# Altium footprint library PartsDatabaseV16.1.PcbLib: 145 footprints (part 7 of 10)
Each footprint in its own frame and in the unit in brackets; x right, y up, seen from the top. Pads: shape width x height; smd on the part's side, far side on the other; paste and mask are expansions set on the pad; w line width, h text height; cw(c..) or ccw(c..) is an arc to the next point about the centre after c.
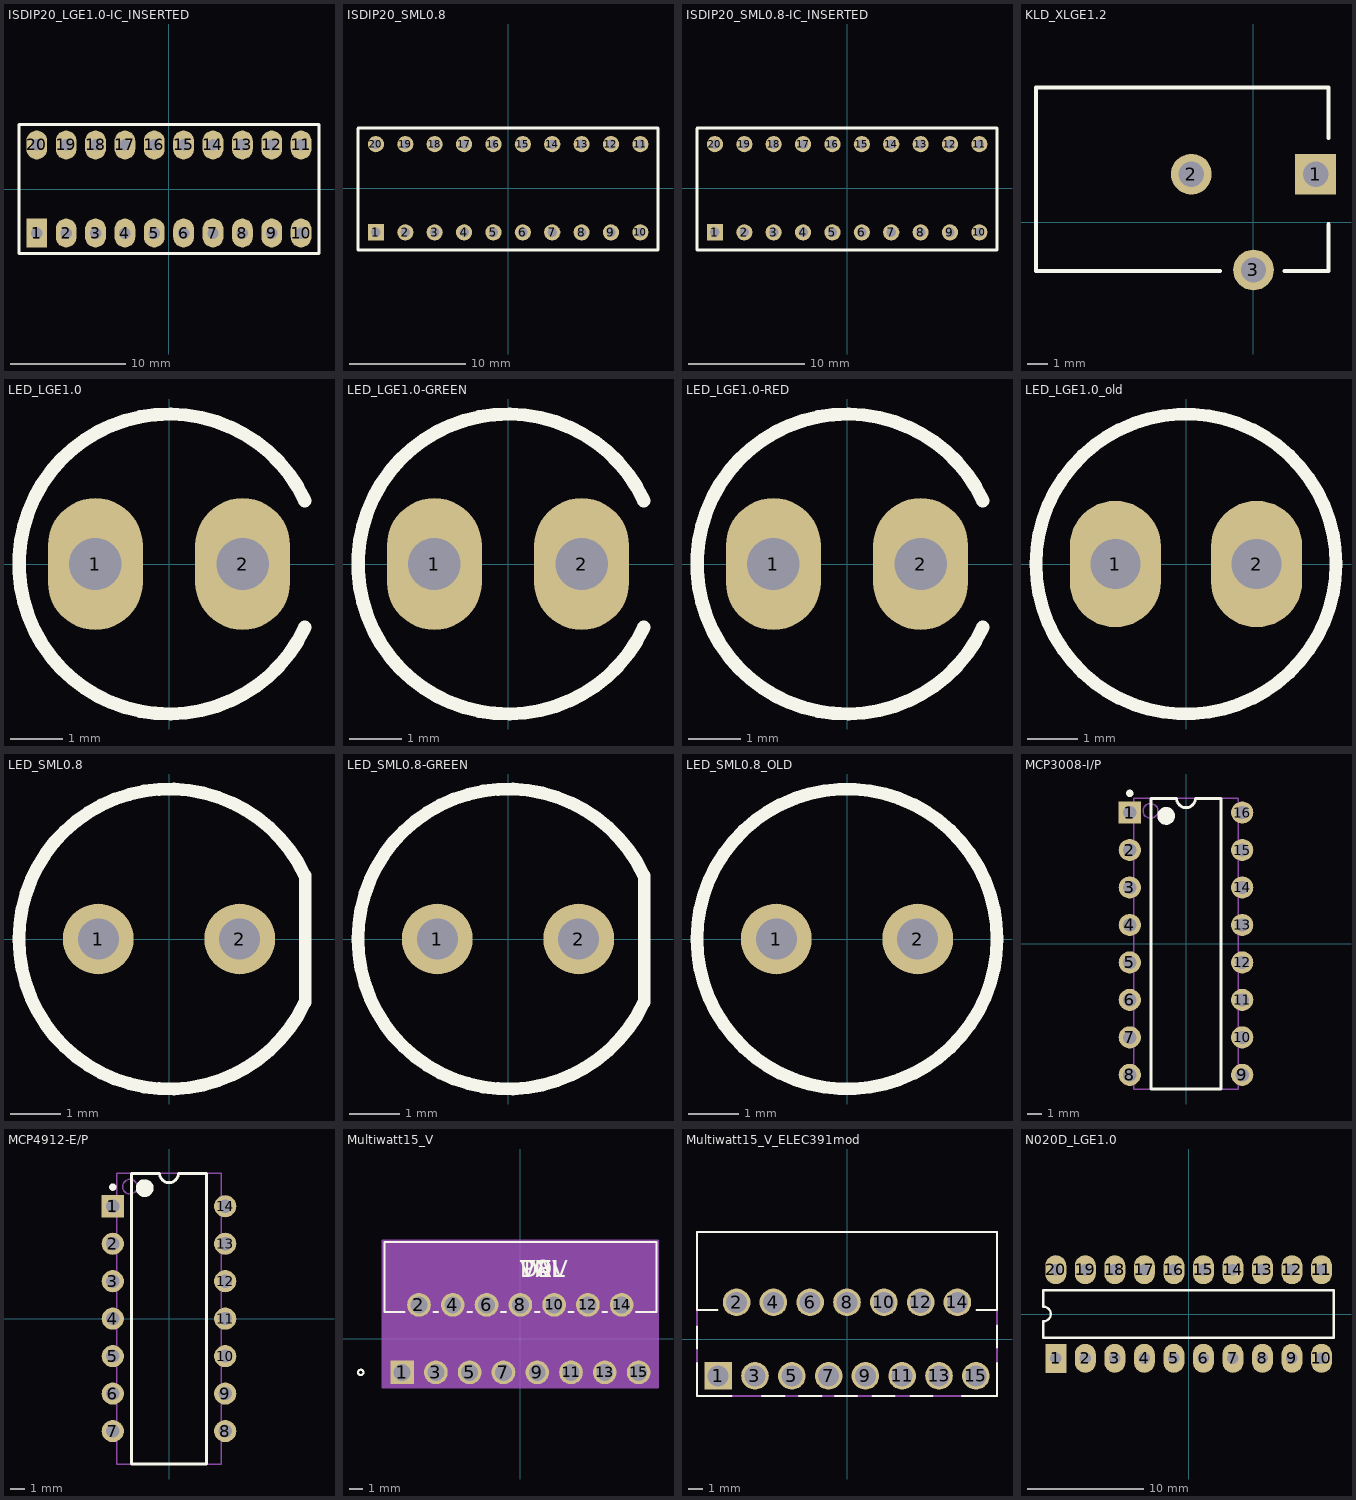
[diagram p6: the footprints below, top view; thin cyan lines are the x and y axes]

## ISDIP20_LGE1.0-IC_INSERTED [mm] "DIP; 16 Rectangular Pins; Row Space 7.62 mm; Pitch 2.54 mm"
height 11.94
pads (20):
  rect 1.8x2.5 hole 0.991: 1(-11.43,-3.81)
  oval 1.8x2.5 hole 0.991: 2(-8.89,-3.81) 3(-6.35,-3.81) 4(-3.81,-3.81) 5(-1.27,-3.81) 6(1.27,-3.81) 7(3.81,-3.81) 8(6.35,-3.81) 9(8.89,-3.81) 10(11.43,-3.81) 11(11.43,3.81) 12(8.89,3.81) 13(6.35,3.81) 14(3.81,3.81) 15(1.27,3.81) 16(-1.27,3.81) 17(-3.81,3.81) 18(-6.35,3.81) 19(-8.89,3.81) 20(-11.43,3.81)
Top Overlay:
  lines w0.25: 12.97,-5.588 -12.97,-5.588 -12.97,3.175 -12.97,5.588 12.97,5.588 ; 12.979,-5.588 12.979,5.588
3D body "DIP20.STEP": height 8.34, standoff -0.04, extent -13.245,-3.834 13.295,3.986
3D body "DIP20_socket.step": height 5, standoff -3, extent -12.763,-5.093 12.637,5.067

## ISDIP20_SML0.8 [mm] "DIP; 16 Rectangular Pins; Row Space 7.62 mm; Pitch 2.54 mm"
height 11.94
pads (20):
  rect 1.4x1.4 hole 0.813: 1(-11.43,-3.81)
  round 1.4 hole 0.813: 2(-8.89,-3.81) 3(-6.35,-3.81) 4(-3.81,-3.81) 5(-1.27,-3.81) 6(1.27,-3.81) 7(3.81,-3.81) 8(6.35,-3.81) 9(8.89,-3.81) 10(11.43,-3.81) 11(11.43,3.81) 12(8.89,3.81) 13(6.35,3.81) 14(3.81,3.81) 15(1.27,3.81) 16(-1.27,3.81) 17(-3.81,3.81) 18(-6.35,3.81) 19(-8.89,3.81) 20(-11.43,3.81)
Top Overlay:
  lines w0.25: -12.97,-5.34 12.954,-5.34 12.954,5.169 ; -12.954,5.207 12.954,5.207
  lines w0.254: -12.979,-5.309 -12.979,5.182
3D body "DIP20_socket.step": height 5, standoff -3, extent -12.725,-5.029 12.675,5.131

## ISDIP20_SML0.8-IC_INSERTED [mm] "DIP; 16 Rectangular Pins; Row Space 7.62 mm; Pitch 2.54 mm"
height 11.94
pads (20):
  rect 1.4x1.4 hole 0.813: 1(-11.43,-3.81)
  round 1.4 hole 0.813: 2(-8.89,-3.81) 3(-6.35,-3.81) 4(-3.81,-3.81) 5(-1.27,-3.81) 6(1.27,-3.81) 7(3.81,-3.81) 8(6.35,-3.81) 9(8.89,-3.81) 10(11.43,-3.81) 11(11.43,3.81) 12(8.89,3.81) 13(6.35,3.81) 14(3.81,3.81) 15(1.27,3.81) 16(-1.27,3.81) 17(-3.81,3.81) 18(-6.35,3.81) 19(-8.89,3.81) 20(-11.43,3.81)
Top Overlay:
  lines w0.25: -12.97,-5.34 12.954,-5.34 12.954,5.169 ; -12.954,5.207 12.954,5.207
  lines w0.254: -12.979,-5.309 -12.979,5.182
3D body "DIP20_socket.step": height 5, standoff -3, extent -12.738,-5.169 12.662,4.991
3D body "DIP20.STEP": height 8.56, standoff 0.18, extent -13.283,-3.885 13.257,3.935

## KLD_XLGE1.2 [mil] "DC Power Jack, PCB Mount"
pads (3):
  rect 78.74x78.74 hole 49: 1(120,92.5)
  round 78.74 hole 49: 2(-120,92.5) 3(0,-92.5)
Top Overlay:
  lines w7.87: -65,-94.67 -420,-94.67 -420,259.67 145,259.67 145,162.5 ; 60,-94.67 145,-94.67 145,-4.11
3D body "PwrJack2.1mm.step": height 433.55, standoff -137.32, extent -453.22,-103.08 145.21,267

## LED_LGE1.0 [mm] "2.8 mm (typ)"
pads (2):
  oval 1.8x2.5 hole 0.991: 1(-1.397,0) 2(1.397,0)
Top Overlay:
  lines w0.254: 2.578,-1.202 cw(c0,0) 2.578,1.202
3D body "redLED.STEP": height 12.3, standoff -2.5, extent -2.984,-3.048 2.436,2.972

## LED_LGE1.0-GREEN [mm] "2.8 mm (typ)"
pads (2):
  oval 1.8x2.5 hole 0.991: 1(-1.397,0) 2(1.397,0)
Top Overlay:
  lines w0.254: 2.578,-1.202 cw(c0,0) 2.578,1.202

## LED_LGE1.0-RED [mm] "2.8 mm (typ)"
pads (2):
  oval 1.8x2.5 hole 0.991: 1(-1.397,0) 2(1.397,0)
Top Overlay:
  lines w0.254: 2.578,-1.202 cw(c0,0) 2.578,1.202
3D body "redLED.STEP": height 12.3, standoff -2.5, extent -3.058,-2.883 2.362,3.137

## LED_LGE1.0_old [mm] "2.8 mm (typ)"
pads (2):
  oval 1.8x2.5 hole 0.991: 1(-1.397,0) 2(1.397,0)
Top Overlay:
  circle w0.254: c0,0 r2.965
3D body "redLED.STEP": height 12.3, standoff -2.5, extent -2.415,-3.022 3.005,2.997

## LED_SML0.8 [mm] "2.8 mm (typ)"
pads (2):
  round 1.4 hole 0.813: 1(-1.397,0) 2(1.397,0)
Top Overlay:
  lines w0.254: 2.687,-1.253 cw(c0,0) 2.687,1.253 ; 2.692,-1.232 2.692,1.257

## LED_SML0.8-GREEN [mm] "2.8 mm (typ)"
pads (2):
  round 1.4 hole 0.813: 1(-1.397,0) 2(1.397,0)
Top Overlay:
  lines w0.254: 2.687,-1.253 cw(c0,0) 2.687,1.253 ; 2.692,-1.194 2.692,1.245

## LED_SML0.8_OLD [mm] "2.8 mm (typ)"
pads (2):
  round 1.4 hole 0.813: 1(-1.397,0) 2(1.397,0)
Top Overlay:
  circle w0.254: c0,0 r2.965

## MCP3008-I/P [mm] "ADC (16-DIP)"
pads (16):
  rect 1.5x1.5 hole 0.889: 1(-3.81,8.89)
  round 1.5 hole 0.889: 2(-3.81,6.35) 3(-3.81,3.81) 4(-3.81,1.27) 5(-3.81,-1.27) 6(-3.81,-3.81) 7(-3.81,-6.35) 8(-3.81,-8.89) 9(3.81,-8.89) 10(3.81,-6.35) 11(3.81,-3.81) 12(3.81,-1.27) 13(3.81,1.27) 14(3.81,3.81) 15(3.81,6.35) 16(3.81,8.89)
Top Overlay:
  circle w0.25: c-3.81,10.19 r0.125
  circle w0.6: c-1.346,8.661 r0.3
  lines w0.2: -2.362,-9.85 -2.362,9.85 -0.635,9.85 ccw(c0,9.85) 0.635,9.85 2.362,9.85 2.362,-9.85 -2.362,-9.85
Mechanical 13:
  circle w0.1: c-2.4,9 r0.5
  lines w0.1: -3.55,-9.85 -3.55,9.85 3.55,9.85 3.55,-9.85 -3.55,-9.85
3D body: height 5.34, standoff 0.38, extent -3.549,-9.849 3.549,9.849

## MCP4912-E/P [mm] "DAC (14-DIP)"
height 5.34
pads (14):
  rect 1.5x1.5 hole 0.889: 1(-3.81,7.62)
  round 1.5 hole 0.889: 2(-3.81,5.08) 3(-3.81,2.54) 4(-3.81,0) 5(-3.81,-2.54) 6(-3.81,-5.08) 7(-3.81,-7.62) 8(3.81,-7.62) 9(3.81,-5.08) 10(3.81,-2.54) 11(3.81,0) 12(3.81,2.54) 13(3.81,5.08) 14(3.81,7.62)
Top Overlay:
  circle w0.6: c-1.65,8.85 r0.3
  circle w0.25: c-3.81,8.92 r0.125
  lines w0.2: -2.54,-9.85 2.54,-9.85 2.54,9.85 0.635,9.85 cw(c0,9.85) -0.635,9.85 -2.54,9.85 -2.54,-9.85
Mechanical 13:
  circle w0.1: c-2.65,8.95 r0.5
  lines w0.1: -3.55,-9.85 3.55,-9.85 3.55,9.85 -3.55,9.85 -3.55,-9.85
3D body: height 5.33, standoff 0, extent -3.55,-9.85 3.55,9.85

## Multiwatt15_V [mil]
pads (15):
  rect 70x70 / inner round 60 / far side rect 70x70 hole 50: 1(-350,-100)
  round 70 / inner round 60 / far side round 70 hole 50: 2(-300,100) 3(-250,-100) 4(-200,100) 5(-150,-100) 6(-100,100) 7(-50,-100) 8(0,100) 9(50,-100) 10(100,100) 11(150,-100) 12(200,100) 13(250,-100) 14(300,100) 15(350,-100)
Top Overlay:
  circle w6: c-472.5,-100 r8
  lines w6: -343.13,78.71 -402.5,78.71 -402.5,285.71 402.5,285.71 402.5,78.71 343.13,78.71 ; -256.87,78.71 -243.13,78.71 ; -156.87,78.71 -143.13,78.71 ; -56.87,78.71 -43.13,78.71 ; 43.13,78.71 56.87,78.71 ; 143.13,78.71 156.87,78.71 ; 243.13,78.71 256.87,78.71
  text "PN" at 0,182.21 h50
  text "DEV" at 0,182.21 h50
  text "VAL" at 0,182.21 h50
  text "TOL" at 0,182.21 h50
Mechanical 13:
  circle w0: c-387.5,93.71 r8
  text "RefDes2" at 0,182.21 h50
Mechanical 15:
  region: 407.5,290.71 -407.5,290.71 -407.5,-145 407.5,-145
  lines w6: -407.5,-145 -407.5,290.71 407.5,290.71 407.5,-145 -407.5,-145

## Multiwatt15_V_ELEC391mod [mil]
pads (15):
  rect 75x75 hole 57: 1(-350,-100)
  round 75 hole 57: 2(-300,100) 3(-250,-100) 4(-200,100) 5(-150,-100) 6(-100,100) 7(-50,-100) 8(0,100) 9(50,-100) 10(100,100) 11(150,-100) 12(200,100) 13(250,-100) 14(300,100) 15(350,-100)
Top Overlay:
  lines w6: -407.5,-65 -407.5,-154.5 -313.5,-154.5 ; -407.5,-25 -407.5,34.5 ; -351.5,78.71 -407.5,78.71 -407.5,290.5 407.5,290.5 407.5,78.71 352.5,78.71 ; -230,-154.5 -170.5,-154.5 ; -129.5,-154.5 -70,-154.5 ; -32,-154.5 27.5,-154.5 ; 69.5,-154.5 129,-154.5 ; 173,-154.5 232.5,-154.5 ; 313,-154.5 407.5,-154.5 407.5,-65 ; 407.5,-23 407.5,36.5
Mechanical 15:
  lines w6: -407.5,-154.5 -407.5,290.71 407.5,290.71 407.5,-154.5 -407.5,-154.5
3D body "MULTIWATT15.step": height 825.79, standoff -155.12, extent -385,-100 386.66,257.01

## N020D_LGE1.0 [mm] "DIP; 20 Leads; Row Spacing 7.62 mm; Pitch 2.54 mm"
height 5.08
pads (20):
  rect 1.8x2.5 hole 0.991: 1(-11.43,-3.81)
  oval 1.8x2.5 hole 0.991: 2(-8.89,-3.81) 3(-6.35,-3.81) 4(-3.81,-3.81) 5(-1.27,-3.81) 6(1.27,-3.81) 7(3.81,-3.81) 8(6.35,-3.81) 9(8.89,-3.81) 10(11.43,-3.81) 11(11.43,3.81) 12(8.89,3.81) 13(6.35,3.81) 14(3.81,3.81) 15(1.27,3.81) 16(-1.27,3.81) 17(-3.81,3.81) 18(-6.35,3.81) 19(-8.89,3.81) 20(-11.43,3.81)
Top Overlay:
  lines w0.2: -12.5,-2.032 12.5,-2.032 12.5,2.032 -12.5,2.032 -12.5,0.635 cw(c-12.5,0) -12.5,-0.635 -12.5,-2.032
3D body "DIP20.STEP": height 4.62, standoff -3.76, extent -13.256,-3.91 13.284,3.91